# Altium footprint library CMR_Miscellaneous_Devices.PcbLib: 103 footprints (part 7 of 7)
Each footprint in its own frame and in the unit in brackets; x right, y up, seen from the top. Pads: shape width x height; smd on the part's side, far side on the other; paste and mask are expansions set on the pad; w line width, h text height; cw(c..) or ccw(c..) is an arc to the next point about the centre after c.
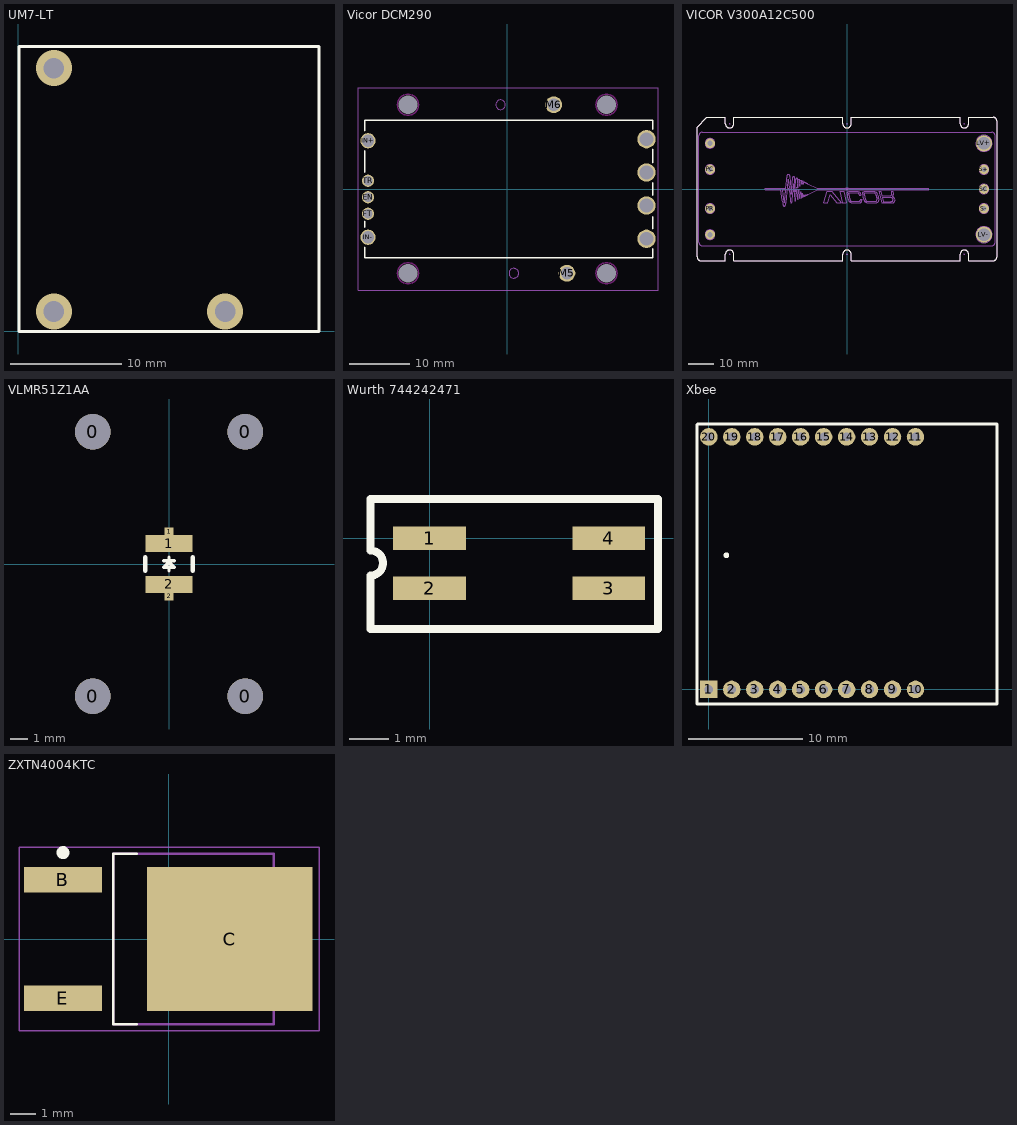
[diagram p6: the footprints below, top view; thin cyan lines are the x and y axes]

## UM7-LT [mm] "UM7-LT Orientation Sensor"
via 3.175,23.622 diameter 3.25 hole 1.85
via 18.542,1.778 diameter 3.25 hole 1.85
via 3.175,1.778 diameter 3.25 hole 1.85
Top Overlay:
  lines w0.254: 0.046,-0.016 26.971,-0.016 26.971,25.559 0.046,25.559 0.046,-0.016
3D body "PCB.STEP": height 7.2, standoff 0.79, extent 0.096,0 26.924,25.419

## Vicor DCM290 [mil] "DC-DC Converter"
pads (15):
  round 80 hole 60: EN(-909,-54) FT(-909,-162) TR(-909,54)
  round 100 hole 80: IN+(-909,315) IN-(-909,-315)
  round 0 hole 122.05 unplated: M1(-648.43,-550) M2(648.43,-550) M3(648.43,550) M4(-648.43,550)
  round 110 hole 80: M5(389.53,-550) M6(303.54,550)
  round 120 hole 90: OUT+_1(909,325) OUT+_2(909,-108) OUT-_1(909,108) OUT-_2(909,-325)
Top Overlay:
  lines w10: -930,-380 -930,-450 950,-450 950,-390 ; -930,-250 -930,-210 ; -930,110 -930,250 ; -930,380 -930,450 950,450 950,390 ; 950,-260 950,-180 ; 950,-40 950,40 ; 950,170 950,260
Keep-Out Layer:
  circle w10: c648,550 r69
  circle w10: c-648,550 r69
  circle w10: c-648,-550 r69
  circle w10: c648,-550 r69
Mechanical 1:
  circle w1.97: c42.99,-550 r31.5
  circle w1.97: c-42.99,550 r31.5
  text "Heatsink PN 40532 / Note: GND tab rotated for LV/HV spacing" at 500,-440 h10
Mechanical 15:
  lines w1.97: -974.41,-659.45 -974.41,305.12 -974.41,659.45 984.25,659.45 984.25,328.74 984.25,-442.91 984.25,-659.45 -610.24,-659.45 -974.41,-659.45
3D body: height 63, standoff -645, extent 603.01,505.09 693.01,594.92
3D body: height -645, standoff -665, extent 580,480 720,620
3D body: height 63, standoff -645, extent -692.99,505.09 -602.99,594.92
3D body: height -645, standoff -665, extent -716,480 -576,620
3D body: height 63, standoff -645, extent -692.99,-594.91 -602.99,-505.08
3D body: height -645, standoff -665, extent -716,-620 -576,-480
3D body: height -645, standoff -665, extent 580,-620 720,-480
3D body: height 63, standoff -645, extent 603.01,-594.91 693.01,-505.08
3D body "4623_dcm_thruhole.STEP": height 325.71, standoff -124.32, extent -935,-448.82 951.29,448.82
3D body "40261.STEP": height 1083.03, standoff 335, extent -905.51,-648.42 905.51,648.43

## VICOR V300A12C500 [mil]
pads (9):
  round 150 hole 82: HV+(-2100,700) HV-(-2100,-700) PC(-2100,300) PR(-2100,-300) S+(2100,300) S-(2100,-300) SC(2100,0)
  round 250 hole 194: LV+(2100,700) LV-(2100,-700)
Top Overlay:
  lines w8: -2300,-1040 ccw(c-2240,-1040) -2240,-1100 -1864.5,-1100 -1864.5,-1000 cw(c-1800,-1000) -1735.5,-1000 -1735.5,-1100 -64.5,-1100 -64.5,-1000 cw(c0,-1000) 64.5,-1000 64.5,-1100 1735.5,-1100 1735.5,-1000 cw(c1800,-1000) 1864.5,-1000 1864.5,-1100 2240,-1100 ccw(c2240,-1040) 2300,-1040 2300,1040 ccw(c2240,1040) 2240,1100 1864.5,1100 1864.5,1000 cw(c1800,1000) 1735.5,1000 1735.5,1100 64.5,1100 64.5,1000 cw(c0,1000) -64.5,1000 -64.5,1100 -1735.5,1100 -1735.5,1000 cw(c-1800,1000) -1864.5,1000 -1864.5,1100 -2150,1100 -2300,950 -2300,-1040
Mechanical 1:
  drawing of 1242 lines, arcs and shapes, not listed
Mechanical 2:
  circle w1: c2100,300 r75
  circle w1: c2100,0 r75
  circle w1: c2100,-300 r75
  circle w1: c2100,700 r125
  circle w1: c2100,-700 r125
  circle w1: c2100,300 r47
  circle w1: c2100,0 r47
  circle w1: c2100,-300 r47
  circle w1: c2100,700 r97
  circle w1: c2100,-700 r97
  circle w1: c2100,-300 r40
  circle w1: c2100,0 r40
  circle w1: c2100,300 r40
  circle w1: c2100,-700 r90
  circle w1: c2100,700 r90
  circle w1: c-2100,700 r75
  circle w1: c-2100,300 r75
  circle w1: c-2100,-300 r75
  circle w1: c-2100,-700 r75
  circle w1: c-2100,700 r47
  circle w1: c-2100,300 r47
  circle w1: c-2100,-300 r47
  circle w1: c-2100,-700 r47
  circle w1: c-2100,-700 r40
  circle w1: c-2100,-300 r40
  circle w1: c-2100,300 r40
  circle w1: c-2100,700 r40
Drill Drawing:
  circle w3: c2100,-700 r97
  circle w3: c2100,700 r97
  circle w3: c2100,-300 r47
  circle w3: c2100,0 r47
  circle w3: c2100,300 r47
  circle w3: c-2100,-700 r47
  circle w3: c-2100,-300 r47
  circle w3: c-2100,300 r47
  circle w3: c-2100,700 r47
3D body "37205r1-VxxAxxxxxxBL3P.STP": height 503.81, standoff -126.19, extent -2300,-1100.39 2300,1099.61

## VLMR51Z1AA [mm] "VLMR51Z1AA SMT LED"
pads (8):
  round 2.1 hole 2.1 unplated: 0(-4.5,-7.8) 0(-4.5,7.8) 0(4.5,-7.8) 0(4.5,7.8)
  rect 2.8x1 smd: 1(0,1.2) 2(0,-1.2)
  rect 0.505x0.5 smd: 1(0,1.9) 2(0,-1.9)
Top Overlay:
  lines w0.2: -0.3,0.2 0.3,0.2 ; 0,-0.4 0,-0.2 ; 0,0.2 0,0.4 ; -0.3,-0.2 0.3,-0.2 0,0.1 -0.3,-0.2
  lines w0.254: -1.4,-0.4 -1.4,0.4 ; 1.4,-0.4 1.4,0.4
3D body "PLCC-2 package 3D model.stp": height 1.62, standoff -0.03, extent -1.403,-1.749 1.397,1.749
3D body "10734_Iss1_230409.STEP": height 12.3, standoff -0.8, extent -11.05,-10.951 11.05,11
3D body: height 10.65, standoff 10.6, extent -9.85,-9.847 9.85,9.847

## Wurth 744242471 [mm]
pads (4):
  rect 1.85x0.6 smd: 1(0,0) 2(0,-1.27) 3(4.55,-1.27) 4(4.55,0)
Top Overlay:
  lines w0.2: -1.5,-2.3 5.8,-2.3 5.8,1 -1.5,1 -1.5,-0.308 cw(c-1.5,-0.625) -1.5,-0.943 -1.5,-2.3
3D body "STEP-WE-SLM-rev1.stp": height 3.25, standoff 0, extent -0.7,-2.25 5.3,1.05

## Xbee [mil]
pads (20):
  rect 60x60 hole 30: 1(0,0)
  round 60 hole 30: 2(78.74,0) 3(157.48,0) 4(236.22,0) 5(314.96,0) 6(393.7,0) 7(472.44,0) 8(551.18,0) 9(629.92,0) 10(708.66,0) 11(708.66,866.14) 12(629.92,866.14) 13(551.18,866.14) 14(472.44,866.14) 15(393.7,866.14) 16(314.96,866.14) 17(236.22,866.14) 18(157.48,866.14) 19(78.74,866.14) 20(0,866.14)
Top Overlay:
  circle w10: c60,460 r5
  lines w10: -40.55,-50 988.19,-50 988.19,910 -38.82,910 -40.55,908.27 -40.55,-50
3D body "User Library-WRL_10419.step": height 306.29, standoff -129, extent -812,-47 1008,913

## ZXTN4004KTC [mm] "D-PAK, 3-Pads, Body 6.20x6.65mm (max), IPC Medium Density"
height 2.39
pads (3):
  rect 3x1 smd: B(-4.1,2.29) E(-4.1,-2.29)
  rect 6.4x5.55 smd: C(2.35,0)
Top Overlay:
  circle w0.25: c-4.1,3.34 r0.125
  lines w0.1: -1.25,-3.3 -2.15,-3.3 -2.15,3.3 -1.25,3.3
Mechanical 13:
  lines w0.1: -2.15,-3.3 -2.15,3.3 4.05,3.3 4.05,-3.3 -2.15,-3.3
Mechanical 15:
  lines w0.05: -5.8,-3.55 -5.8,3.55 5.8,3.55 5.8,-3.55 -5.8,-3.55
  lines w0.1: -0.5,0 0.5,0 ; 0,-0.5 0,0.5
3D body "DPAK229P991X239-3N.step": height 2.39, standoff 0, extent -4.415,-3.3 5.49,3.3